# Altium footprint library Wurth_Elektronik_Electromechanic_Wire_to_Board_Connectors_rev16a.PCBLIB: 662 footprints (part 13 of 42)
Each footprint in its own frame and in the unit in brackets; x right, y up, seen from the top. Pads: shape width x height; smd on the part's side, far side on the other; paste and mask are expansions set on the pad; w line width, h text height; cw(c..) or ccw(c..) is an arc to the next point about the centre after c.
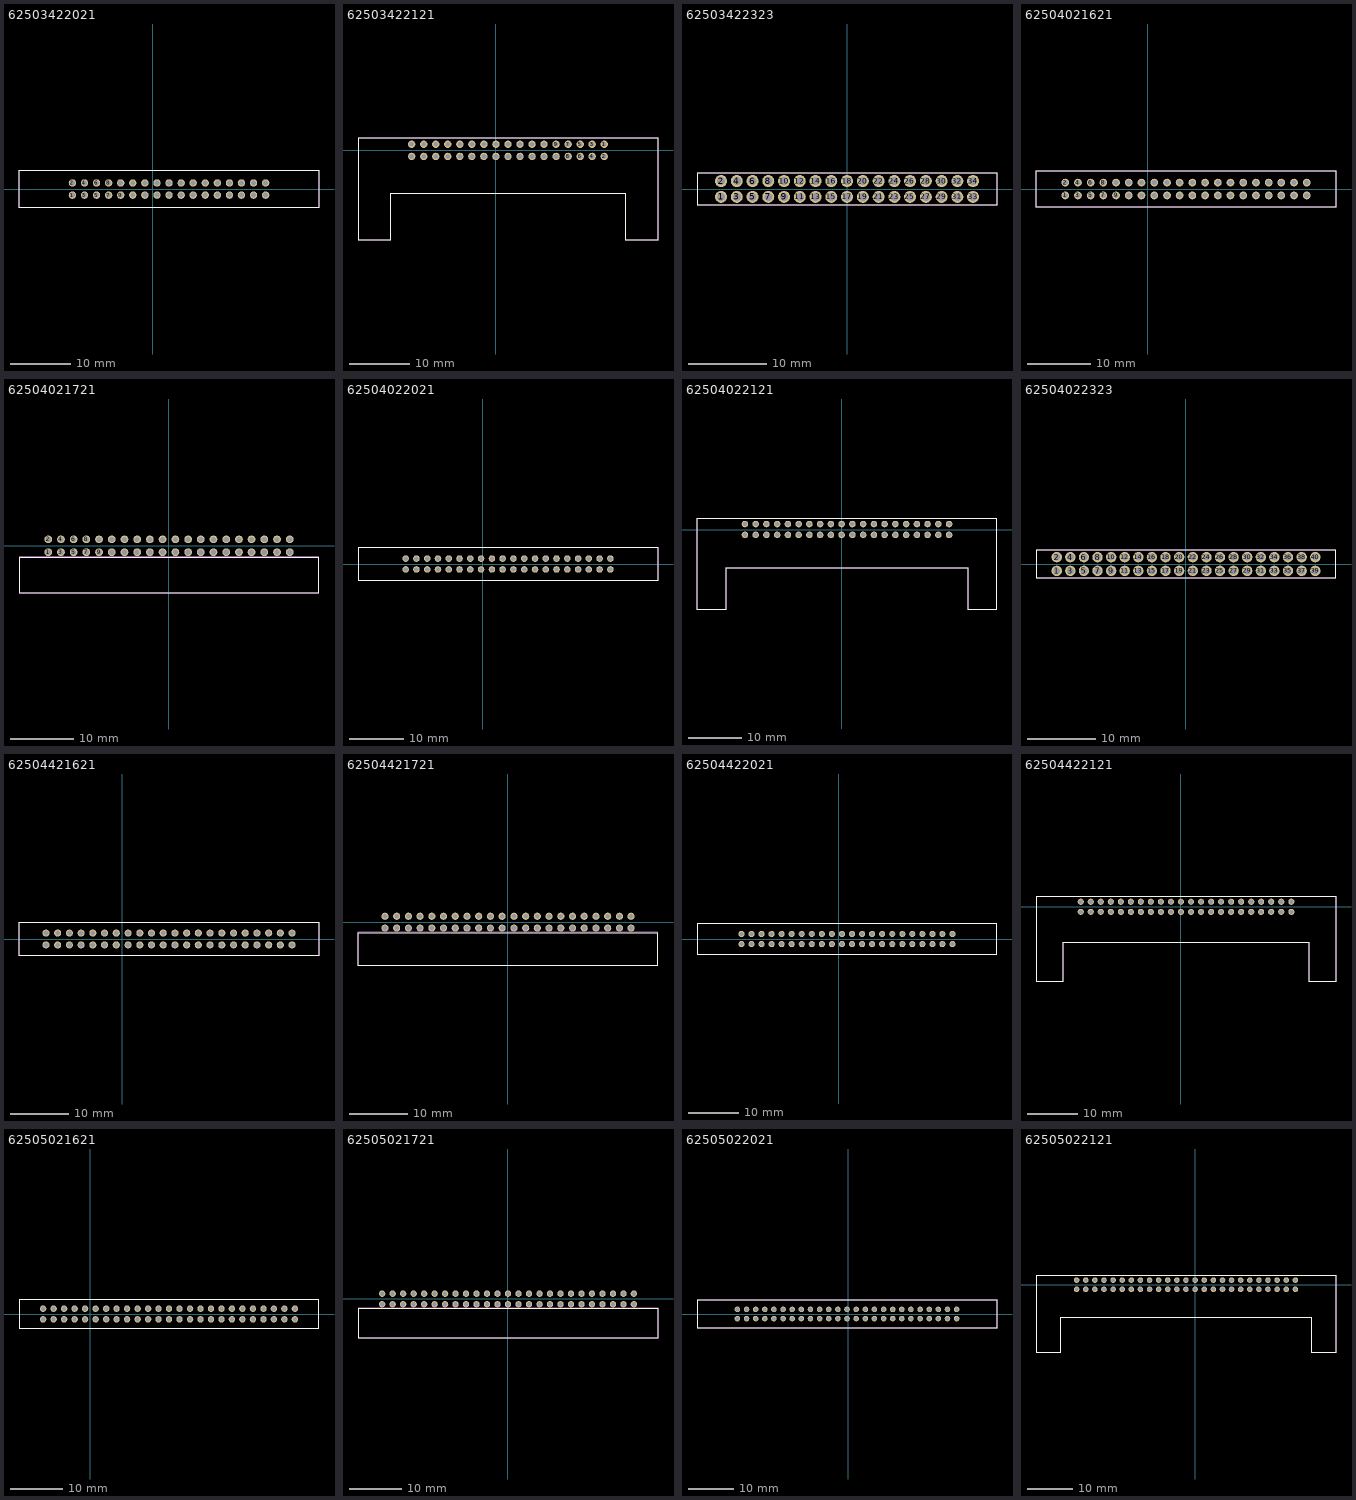
[diagram p12: the footprints below, top view; thin cyan lines are the x and y axes]

## 62503422021 [mil]
pads (34):
  round 48 hole 32: 1(-522.44,-39.37) 2(-522.44,40) 3(-443.7,-39.37) 4(-443.7,40) 5(-364.96,-39.37) 6(-364.96,40) 7(-286.22,-39.37) 8(-286.22,40) 9(-207.48,-39.37) 10(-207.48,40) 11(-128.74,-39.37) 12(-128.74,40) 13(-50,-39.37) 14(-50,40) 15(29,-39.37) 16(29,40) 17(108,-39.37) 18(108,40) 19(187,-39.37) 20(187,40) 21(265,-39.37) 22(265,40) 23(344,-39.37) 24(344,40) 25(423,-39.37) 26(423,40) 27(502,-39.37) 28(502,40) 29(580,-39.37) 30(580,40) 31(659,-39.37) 32(659,40) 33(738,-39.37) 34(738,40)
Top Overlay:
  lines w5: -870.87,-118.11 1086,-118.11 1086,119 -870.87,119 -870.87,-118.11
Mechanical 2:
  text ">NAME" at -1.18,138 h77.5
Mechanical 4:
  text ">VALUE" at -1.18,-177.17 h77.5
Mechanical 16:
  lines w5: -870.87,-118.11 -870.87,119 1086,119 1086,-118.11 -870.87,-118.11
  text "1" at -542.13,-59.06 h77.5
  text "34" at 717,20 h77.5

## 62503422121 [mil]
pads (34):
  round 48 hole 32: 1(709,40) 2(709,-39.37) 3(630,40) 4(630,-39.37) 5(552,40) 6(552,-39.37) 7(473,40) 8(473,-39.37) 9(394,40) 10(394,-39.37) 11(315,40) 12(315,-39.37) 13(237,40) 14(237,-39.37) 15(158,40) 16(158,-39.37) 17(79,40) 18(79,-39.37) 19(0,40) 20(0,-39.37) 21(-78.74,40) 22(-78.74,-39.37) 23(-157.48,40) 24(-157.48,-39.37) 25(-236.22,40) 26(-236.22,-39.37) 27(-314.96,40) 28(-314.96,-39.37) 29(-393.7,40) 30(-393.7,-39.37) 31(-472.44,40) 32(-472.44,-39.37) 33(-551.18,40) 34(-551.18,-39.37)
Top Overlay:
  lines w5: -902.56,-584.65 -688.98,-584.65 -688.98,-279.53 847,-279.53 847,-584.65 1061,-584.65 1061,79 -902.56,79 -902.56,-584.65
Mechanical 2:
  text ">NAME" at -1176.77,-192.32 h77.5
Mechanical 4:
  text ">VALUE" at -1188.58,-266.54 h77.5
Mechanical 16:
  lines w5: -902.56,-584.65 -902.56,79 1061,79 1061,-584.65 847,-584.65 847,-279.53 -688.98,-279.53 -688.98,-584.65 -902.56,-584.65
  text "1" at 692,16 h77.5
  text "34" at -597.24,-80.31 h77.5

## 62503422323 [mil]
pads (34):
  round 60 hole 40: 1(-629.92,-39.37) 2(-629.92,40) 3(-551.18,-39.37) 4(-551.18,40) 5(-472.44,-39.37) 6(-472.44,40) 7(-393.7,-39.37) 8(-393.7,40) 9(-314.96,-39.37) 10(-314.96,40) 11(-236.22,-39.37) 12(-236.22,40) 13(-157.48,-39.37) 14(-157.48,40) 15(-78.74,-39.37) 16(-78.74,40) 17(0,-39.37) 18(0,40) 19(79,-39.37) 20(79,40) 21(158,-39.37) 22(158,40) 23(237,-39.37) 24(237,40) 25(315,-39.37) 26(315,40) 27(394,-39.37) 28(394,40) 29(473,-39.37) 30(473,40) 31(552,-39.37) 32(552,40) 33(630,-39.37) 34(630,40)
Top Overlay:
  lines w5: -750,-78.74 750,-78.74 750,79 -750,79 -750,-78.74
Mechanical 2:
  text ">NAME" at -108.66,113 h77.5
Mechanical 4:
  text ">VALUE" at -158.66,-152.17 h77.5
Mechanical 16:
  lines w5: -750,-78.74 -750,79 750,79 750,-78.74 -750,-78.74
  text "1" at -649.61,-59.06 h77.5
  text "34" at 610,20 h77.5

## 62504021621 [mil]
pads (40):
  round 48 hole 32: 1(-511.81,-39.37) 2(-511.81,40) 3(-433.07,-39.37) 4(-433.07,40) 5(-354.33,-39.37) 6(-354.33,40) 7(-275.59,-39.37) 8(-275.59,40) 9(-196.85,-39.37) 10(-196.85,40) 11(-118.11,-39.37) 12(-118.11,40) 13(-39.37,-39.37) 14(-39.37,40) 15(40,-39.37) 16(40,40) 17(119,-39.37) 18(119,40) 19(197,-39.37) 20(197,40) 21(276,-39.37) 22(276,40) 23(355,-39.37) 24(355,40) 25(434,-39.37) 26(434,40) 27(512,-39.37) 28(512,40) 29(591,-39.37) 30(591,40) 31(670,-39.37) 32(670,40) 33(749,-39.37) 34(749,40) 35(827,-39.37) 36(827,40) 37(906,-39.37) 38(906,40) 39(985,-39.37) 40(985,40)
Top Overlay:
  lines w5: -692.91,-108.27 1166,-108.27 1166,109 -692.91,109 -692.91,-108.27
Mechanical 2:
  text ">NAME" at 160,138 h77.5
Mechanical 4:
  text ">VALUE" at 185,-177.17 h77.5
Mechanical 16:
  lines w5: -692.91,-108.27 -692.91,109 1166,109 1166,-108.27 -692.91,-108.27
  text "1" at -531.5,-59.06 h77.5
  text "40" at 953,20 h77.5

## 62504021721 [mil]
pads (40):
  round 48 hole 32: 1(-748.03,-39.37) 2(-748.03,40) 3(-669.29,-39.37) 4(-669.29,40) 5(-590.55,-39.37) 6(-590.55,40) 7(-511.81,-39.37) 8(-511.81,40) 9(-433.07,-39.37) 10(-433.07,40) 11(-354.33,-39.37) 12(-354.33,40) 13(-275.59,-39.37) 14(-275.59,40) 15(-196.85,-39.37) 16(-196.85,40) 17(-118.11,-39.37) 18(-118.11,40) 19(-39.37,-39.37) 20(-39.37,40) 21(40,-39.37) 22(40,40) 23(119,-39.37) 24(119,40) 25(197,-39.37) 26(197,40) 27(276,-39.37) 28(276,40) 29(355,-39.37) 30(355,40) 31(434,-39.37) 32(434,40) 33(512,-39.37) 34(512,40) 35(591,-39.37) 36(591,40) 37(670,-39.37) 38(670,40) 39(749,-39.37) 40(749,40)
Top Overlay:
  lines w5: -929.13,-289.37 930,-289.37 930,-74.8 -929.13,-74.8 -929.13,-289.37
Mechanical 2:
  text ">NAME" at -1228.35,-157.48 h77.5
Mechanical 4:
  text ">VALUE" at -1232.87,-236.22 h77.5
Mechanical 16:
  lines w5: -929.13,-289.37 -929.13,-68.9 930,-68.9 930,-289.37 -929.13,-289.37
  text "1" at -767.72,-59.06 h77.5
  text "40" at 717,20 h77.5

## 62504022021 [mil]
pads (40):
  round 48 hole 32: 1(-561.81,-39.37) 2(-561.81,40) 3(-483.07,-39.37) 4(-483.07,40) 5(-404.33,-39.37) 6(-404.33,40) 7(-325.59,-39.37) 8(-325.59,40) 9(-246.85,-39.37) 10(-246.85,40) 11(-168.11,-39.37) 12(-168.11,40) 13(-89.37,-39.37) 14(-89.37,40) 15(-10.63,-39.37) 16(-10.63,40) 17(69,-39.37) 18(69,40) 19(147,-39.37) 20(147,40) 21(226,-39.37) 22(226,40) 23(305,-39.37) 24(305,40) 25(384,-39.37) 26(384,40) 27(462,-39.37) 28(462,40) 29(541,-39.37) 30(541,40) 31(620,-39.37) 32(620,40) 33(699,-39.37) 34(699,40) 35(777,-39.37) 36(777,40) 37(856,-39.37) 38(856,40) 39(935,-39.37) 40(935,40)
Top Overlay:
  lines w5: -910.24,-118.11 1283,-118.11 1283,119 -910.24,119 -910.24,-118.11
Mechanical 2:
  text ">NAME" at 110,138 h77.5
Mechanical 4:
  text ">VALUE" at 135,-177.17 h77.5
Mechanical 16:
  lines w5: -910.24,-118.11 -910.24,119 1283,119 1283,-118.11 -910.24,-118.11
  text "1" at -581.5,-59.06 h77.5
  text "40" at 903,20 h77.5

## 62504022121 [mil]
pads (40):
  round 48 hole 32: 1(788,40) 2(788,-39.37) 3(709,40) 4(709,-39.37) 5(630,40) 6(630,-39.37) 7(552,40) 8(552,-39.37) 9(473,40) 10(473,-39.37) 11(394,40) 12(394,-39.37) 13(315,40) 14(315,-39.37) 15(237,40) 16(237,-39.37) 17(158,40) 18(158,-39.37) 19(79,40) 20(79,-39.37) 21(0,40) 22(0,-39.37) 23(-78.74,40) 24(-78.74,-39.37) 25(-157.48,40) 26(-157.48,-39.37) 27(-236.22,40) 28(-236.22,-39.37) 29(-314.96,40) 30(-314.96,-39.37) 31(-393.7,40) 32(-393.7,-39.37) 33(-472.44,40) 34(-472.44,-39.37) 35(-551.18,40) 36(-551.18,-39.37) 37(-629.92,40) 38(-629.92,-39.37) 39(-708.66,40) 40(-708.66,-39.37)
Top Overlay:
  lines w5: -1060.04,-584.65 -846.46,-584.65 -846.46,-279.53 926,-279.53 926,-584.65 1139,-584.65 1139,79 -1060.04,79 -1060.04,-584.65
Mechanical 2:
  text ">NAME" at -1348.03,-217.32 h77.5
Mechanical 4:
  text ">VALUE" at -1359.84,-291.54 h77.5
Mechanical 16:
  lines w5: -1060.04,-584.65 -1060.04,79 1139,79 1139,-584.65 926,-584.65 926,-279.53 -846.46,-279.53 -846.46,-584.65 -1060.04,-584.65
  text "1" at 771,16 h77.5
  text "40" at -743.5,-80.31 h77.5

## 62504022323 [mil]
pads (40):
  round 60 hole 40: 1(-748.03,-39.37) 2(-748.03,40) 3(-669.29,-39.37) 4(-669.29,40) 5(-590.55,-39.37) 6(-590.55,40) 7(-511.81,-39.37) 8(-511.81,40) 9(-433.07,-39.37) 10(-433.07,40) 11(-354.33,-39.37) 12(-354.33,40) 13(-275.59,-39.37) 14(-275.59,40) 15(-196.85,-39.37) 16(-196.85,40) 17(-118.11,-39.37) 18(-118.11,40) 19(-39.37,-39.37) 20(-39.37,40) 21(40,-39.37) 22(40,40) 23(119,-39.37) 24(119,40) 25(197,-39.37) 26(197,40) 27(276,-39.37) 28(276,40) 29(355,-39.37) 30(355,40) 31(434,-39.37) 32(434,40) 33(512,-39.37) 34(512,40) 35(591,-39.37) 36(591,40) 37(670,-39.37) 38(670,40) 39(749,-39.37) 40(749,40)
Top Overlay:
  lines w5: -868.11,-78.74 869,-78.74 869,79 -868.11,79 -868.11,-78.74
Mechanical 2:
  text ">NAME" at -101.77,113 h77.5
Mechanical 4:
  text ">VALUE" at -101.77,-152.17 h77.5
Mechanical 16:
  lines w5: -868.11,-78.74 -868.11,79 869,79 869,-78.74 -868.11,-78.74
  text "1" at -767.72,-59.06 h77.5
  text "40" at 717,20 h77.5

## 62504421621 [mil]
pads (44):
  round 48 hole 32: 1(-511.81,-39.37) 2(-511.81,40) 3(-433.07,-39.37) 4(-433.07,40) 5(-354.33,-39.37) 6(-354.33,40) 7(-275.59,-39.37) 8(-275.59,40) 9(-196.85,-39.37) 10(-196.85,40) 11(-118.11,-39.37) 12(-118.11,40) 13(-39.37,-39.37) 14(-39.37,40) 15(40,-39.37) 16(40,40) 17(119,-39.37) 18(119,40) 19(197,-39.37) 20(197,40) 21(276,-39.37) 22(276,40) 23(355,-39.37) 24(355,40) 25(434,-39.37) 26(434,40) 27(512,-39.37) 28(512,40) 29(591,-39.37) 30(591,40) 31(670,-39.37) 32(670,40) 33(749,-39.37) 34(749,40) 35(827,-39.37) 36(827,40) 37(906,-39.37) 38(906,40) 39(985,-39.37) 40(985,40) 41(1063,-39.37) 42(1063,40) 43(1142,-39.37) 44(1142,40)
Top Overlay:
  lines w5: -692.91,-108.27 1323,-108.27 1323,109 -692.91,109 -692.91,-108.27
Mechanical 2:
  text ">NAME" at 160,138 h77.5
Mechanical 4:
  text ">VALUE" at 185,-177.17 h77.5
Mechanical 16:
  lines w5: -692.91,-108.27 -692.91,109 1323,109 1323,-108.27 -692.91,-108.27
  text "1" at -531.5,-59.06 h77.5
  text "44" at 1103,20 h77.5

## 62504421721 [mil]
pads (44):
  round 48 hole 32: 1(-826.77,-39.37) 2(-826.77,40) 3(-748.03,-39.37) 4(-748.03,40) 5(-669.29,-39.37) 6(-669.29,40) 7(-590.55,-39.37) 8(-590.55,40) 9(-511.81,-39.37) 10(-511.81,40) 11(-433.07,-39.37) 12(-433.07,40) 13(-354.33,-39.37) 14(-354.33,40) 15(-275.59,-39.37) 16(-275.59,40) 17(-196.85,-39.37) 18(-196.85,40) 19(-118.11,-39.37) 20(-118.11,40) 21(-39.37,-39.37) 22(-39.37,40) 23(40,-39.37) 24(40,40) 25(119,-39.37) 26(119,40) 27(197,-39.37) 28(197,40) 29(276,-39.37) 30(276,40) 31(355,-39.37) 32(355,40) 33(434,-39.37) 34(434,40) 35(512,-39.37) 36(512,40) 37(591,-39.37) 38(591,40) 39(670,-39.37) 40(670,40) 41(749,-39.37) 42(749,40) 43(827,-39.37) 44(827,40)
Top Overlay:
  lines w5: -1007.87,-289.37 1008,-289.37 1008,-74.8 -1007.87,-74.8 -1007.87,-289.37
Mechanical 2:
  text ">NAME" at -1312.4,-221.26 h77.5
Mechanical 4:
  text ">VALUE" at -1316.93,-131.69 h77.5
Mechanical 16:
  lines w5: -1007.87,-289.37 -1007.87,-68.9 1008,-68.9 1008,-289.37 -1007.87,-289.37
  text "1" at -846.46,-59.06 h77.5
  text "44" at 793,20 h77.5

## 62504422021 [mil]
pads (44):
  round 48 hole 32: 1(-761.81,-39.37) 2(-761.81,40) 3(-683.07,-39.37) 4(-683.07,40) 5(-604.33,-39.37) 6(-604.33,40) 7(-525.59,-39.37) 8(-525.59,40) 9(-446.85,-39.37) 10(-446.85,40) 11(-368.11,-39.37) 12(-368.11,40) 13(-289.37,-39.37) 14(-289.37,40) 15(-210.63,-39.37) 16(-210.63,40) 17(-131.89,-39.37) 18(-131.89,40) 19(-53.15,-39.37) 20(-53.15,40) 21(26,-39.37) 22(26,40) 23(105,-39.37) 24(105,40) 25(184,-39.37) 26(184,40) 27(262,-39.37) 28(262,40) 29(341,-39.37) 30(341,40) 31(420,-39.37) 32(420,40) 33(499,-39.37) 34(499,40) 35(577,-39.37) 36(577,40) 37(656,-39.37) 38(656,40) 39(735,-39.37) 40(735,40) 41(813,-39.37) 42(813,40) 43(892,-39.37) 44(892,40)
Top Overlay:
  lines w5: -1110.24,-118.11 1241,-118.11 1241,119 -1110.24,119 -1110.24,-118.11
Mechanical 2:
  text ">NAME" at -90.55,138 h77.5
Mechanical 4:
  text ">VALUE" at -65.55,-177.17 h77.5
Mechanical 16:
  lines w5: -1110.24,-118.11 -1110.24,119 1241,119 1241,-118.11 -1110.24,-118.11
  text "1" at -781.5,-59.06 h77.5
  text "44" at 853,20 h77.5

## 62504422121 [mil]
pads (44):
  round 48 hole 32: 1(867,40) 2(867,-39.37) 3(788,40) 4(788,-39.37) 5(709,40) 6(709,-39.37) 7(630,40) 8(630,-39.37) 9(552,40) 10(552,-39.37) 11(473,40) 12(473,-39.37) 13(394,40) 14(394,-39.37) 15(315,40) 16(315,-39.37) 17(237,40) 18(237,-39.37) 19(158,40) 20(158,-39.37) 21(79,40) 22(79,-39.37) 23(0,40) 24(0,-39.37) 25(-78.74,40) 26(-78.74,-39.37) 27(-157.48,40) 28(-157.48,-39.37) 29(-236.22,40) 30(-236.22,-39.37) 31(-314.96,40) 32(-314.96,-39.37) 33(-393.7,40) 34(-393.7,-39.37) 35(-472.44,40) 36(-472.44,-39.37) 37(-551.18,40) 38(-551.18,-39.37) 39(-629.92,40) 40(-629.92,-39.37) 41(-708.66,40) 42(-708.66,-39.37) 43(-787.4,40) 44(-787.4,-39.37)
Top Overlay:
  lines w5: -1138.78,-584.65 -925.2,-584.65 -925.2,-279.53 1004,-279.53 1004,-584.65 1218,-584.65 1218,79 -1138.78,79 -1138.78,-584.65
Mechanical 2:
  text ">NAME" at -1444.29,-267.32 h77.5
Mechanical 4:
  text ">VALUE" at -1456.1,-341.54 h77.5
Mechanical 16:
  lines w5: -1138.78,-584.65 -1138.78,79 1218,79 1218,-584.65 1004,-584.65 1004,-279.53 -925.2,-279.53 -925.2,-584.65 -1138.78,-584.65
  text "1" at 850,16 h77.5
  text "44" at -839.76,-80.31 h77.5

## 62505021621 [mil]
pads (50):
  round 48 hole 32: 1(-354.33,-39.37) 2(-354.33,40) 3(-275.59,-39.37) 4(-275.59,40) 5(-196.85,-39.37) 6(-196.85,40) 7(-118.11,-39.37) 8(-118.11,40) 9(-39.37,-39.37) 10(-39.37,40) 11(40,-39.37) 12(40,40) 13(119,-39.37) 14(119,40) 15(197,-39.37) 16(197,40) 17(276,-39.37) 18(276,40) 19(355,-39.37) 20(355,40) 21(434,-39.37) 22(434,40) 23(512,-39.37) 24(512,40) 25(591,-39.37) 26(591,40) 27(670,-39.37) 28(670,40) 29(749,-39.37) 30(749,40) 31(827,-39.37) 32(827,40) 33(906,-39.37) 34(906,40) 35(985,-39.37) 36(985,40) 37(1063,-39.37) 38(1063,40) 39(1142,-39.37) 40(1142,40) 41(1221,-39.37) 42(1221,40) 43(1300,-39.37) 44(1300,40) 45(1378,-39.37) 46(1378,40) 47(1457,-39.37) 48(1457,40) 49(1536,-39.37) 50(1536,40)
Top Overlay:
  lines w5: -535.43,-108.27 1717,-108.27 1717,109 -535.43,109 -535.43,-108.27
Mechanical 2:
  text ">NAME" at 442,138 h77.5
Mechanical 4:
  text ">VALUE" at 442,-177.17 h77.5
Mechanical 16:
  lines w5: -535.43,-108.27 -535.43,109 1717,109 1717,-108.27 -535.43,-108.27
  text "1" at -374.02,-59.06 h77.5
  text "50" at 1511,20 h77.5

## 62505021721 [mil]
pads (50):
  round 48 hole 32: 1(-944.88,-39.37) 2(-944.88,40) 3(-866.14,-39.37) 4(-866.14,40) 5(-787.4,-39.37) 6(-787.4,40) 7(-708.66,-39.37) 8(-708.66,40) 9(-629.92,-39.37) 10(-629.92,40) 11(-551.18,-39.37) 12(-551.18,40) 13(-472.44,-39.37) 14(-472.44,40) 15(-393.7,-39.37) 16(-393.7,40) 17(-314.96,-39.37) 18(-314.96,40) 19(-236.22,-39.37) 20(-236.22,40) 21(-157.48,-39.37) 22(-157.48,40) 23(-78.74,-39.37) 24(-78.74,40) 25(0,-39.37) 26(0,40) 27(79,-39.37) 28(79,40) 29(158,-39.37) 30(158,40) 31(237,-39.37) 32(237,40) 33(315,-39.37) 34(315,40) 35(394,-39.37) 36(394,40) 37(473,-39.37) 38(473,40) 39(552,-39.37) 40(552,40) 41(630,-39.37) 42(630,40) 43(709,-39.37) 44(709,40) 45(788,-39.37) 46(788,40) 47(867,-39.37) 48(867,40) 49(945,-39.37) 50(945,40)
Top Overlay:
  lines w5: -1125.98,-289.37 1126,-289.37 1126,-74.8 -1125.98,-74.8 -1125.98,-289.37
Mechanical 2:
  text ">NAME" at -1388.78,-157.48 h77.5
Mechanical 4:
  text ">VALUE" at -1418.31,-236.22 h77.5
Mechanical 16:
  lines w5: -1125.98,-289.37 -1125.98,-68.9 1126,-68.9 1126,-289.37 -1125.98,-289.37
  text "1" at -964.57,-59.06 h77.5
  text "50" at 920,20 h77.5

## 62505022021 [mil]
pads (50):
  round 48 hole 32: 1(-954.33,-39.37) 2(-954.33,40) 3(-875.59,-39.37) 4(-875.59,40) 5(-796.85,-39.37) 6(-796.85,40) 7(-718.11,-39.37) 8(-718.11,40) 9(-639.37,-39.37) 10(-639.37,40) 11(-560.63,-39.37) 12(-560.63,40) 13(-481.89,-39.37) 14(-481.89,40) 15(-403.15,-39.37) 16(-403.15,40) 17(-324.41,-39.37) 18(-324.41,40) 19(-245.67,-39.37) 20(-245.67,40) 21(-166.93,-39.37) 22(-166.93,40) 23(-88.19,-39.37) 24(-88.19,40) 25(-9.45,-39.37) 26(-9.45,40) 27(70,-39.37) 28(70,40) 29(149,-39.37) 30(149,40) 31(227,-39.37) 32(227,40) 33(306,-39.37) 34(306,40) 35(385,-39.37) 36(385,40) 37(463,-39.37) 38(463,40) 39(542,-39.37) 40(542,40) 41(621,-39.37) 42(621,40) 43(700,-39.37) 44(700,40) 45(778,-39.37) 46(778,40) 47(857,-39.37) 48(857,40) 49(936,-39.37) 50(936,40)
Top Overlay:
  lines w5: -1302.76,-118.11 1284,-118.11 1284,119 -1302.76,119 -1302.76,-118.11
Mechanical 2:
  text ">NAME" at -158.07,138 h77.5
Mechanical 4:
  text ">VALUE" at -158.07,-177.17 h77.5
Mechanical 16:
  lines w5: -1302.76,-118.11 -1302.76,119 1284,119 1284,-118.11 -1302.76,-118.11
  text "1" at -974.02,-59.06 h77.5
  text "50" at 911,20 h77.5

## 62505022121 [mil]
pads (50):
  round 48 hole 32: 1(867,40) 2(867,-39.37) 3(788,40) 4(788,-39.37) 5(709,40) 6(709,-39.37) 7(630,40) 8(630,-39.37) 9(552,40) 10(552,-39.37) 11(473,40) 12(473,-39.37) 13(394,40) 14(394,-39.37) 15(315,40) 16(315,-39.37) 17(237,40) 18(237,-39.37) 19(158,40) 20(158,-39.37) 21(79,40) 22(79,-39.37) 23(0,40) 24(0,-39.37) 25(-78.74,40) 26(-78.74,-39.37) 27(-157.48,40) 28(-157.48,-39.37) 29(-236.22,40) 30(-236.22,-39.37) 31(-314.96,40) 32(-314.96,-39.37) 33(-393.7,40) 34(-393.7,-39.37) 35(-472.44,40) 36(-472.44,-39.37) 37(-551.18,40) 38(-551.18,-39.37) 39(-629.92,40) 40(-629.92,-39.37) 41(-708.66,40) 42(-708.66,-39.37) 43(-787.4,40) 44(-787.4,-39.37) 45(-866.14,40) 46(-866.14,-39.37) 47(-944.88,40) 48(-944.88,-39.37) 49(-1023.62,40) 50(-1023.62,-39.37)
Top Overlay:
  lines w5: -1375,-584.65 -1161.42,-584.65 -1161.42,-279.53 1004,-279.53 1004,-584.65 1218,-584.65 1218,79 -1375,79 -1375,-584.65
Mechanical 2:
  text ">NAME" at -1619.29,-217.32 h77.5
Mechanical 4:
  text ">VALUE" at -1631.1,-316.54 h77.5
Mechanical 16:
  lines w5: -1375,-584.65 -1375,79 1218,79 1218,-584.65 1004,-584.65 1004,-279.53 -1161.42,-279.53 -1161.42,-584.65 -1375,-584.65
  text "1" at 850,16 h77.5
  text "50" at -1064.76,-80.31 h77.5